# Altium footprint library LukaLIBRARY.PcbLib: 784 footprints (part 29 of 49)
Each footprint in its own frame and in the unit in brackets; x right, y up, seen from the top. Pads: shape width x height; smd on the part's side, far side on the other; paste and mask are expansions set on the pad; w line width, h text height; cw(c..) or ccw(c..) is an arc to the next point about the centre after c.
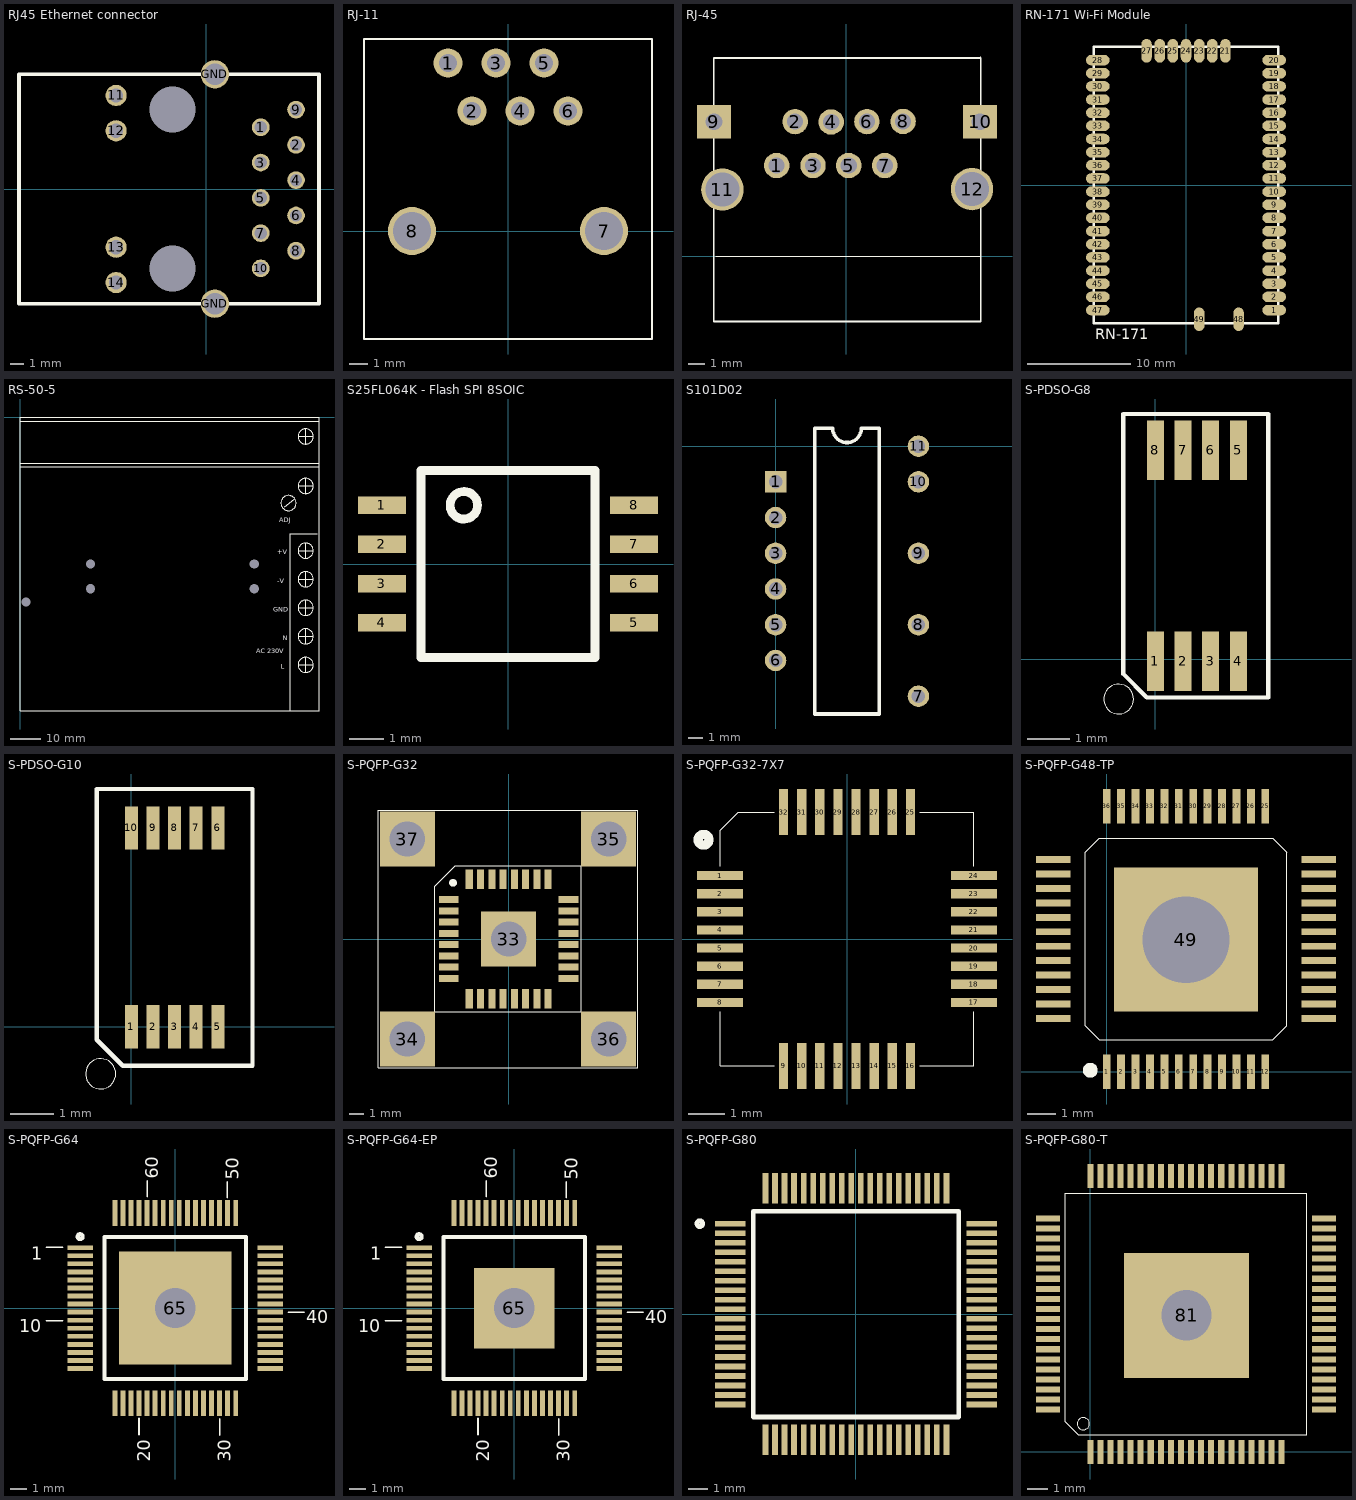
[diagram p28: the footprints below, top view; thin cyan lines are the x and y axes]

## RJ45 Ethernet connector [mil]
pads (18):
  round 50 hole 35: 1(155,175) 2(255,125) 3(155,75) 4(255,25) 5(155,-25) 6(255,-75) 7(155,-125) 8(255,-175) 9(255,225) 10(155,-225)
  round 60 hole 40: 11(-255,265) 12(-255,165) 13(-255,-165) 14(-255,-265)
  round 80 hole 62: GND(25,-325) GND(25,325)
  round 0 hole 130: ""(-95,-225) ""(-95,225)
Top Overlay:
  lines w10: -530,-325 -530,325 320,325 320,-325 -530,-325

## RJ-11 [mil]
pads (8):
  round 60 hole 38 mask-1000: 1(-125,350) 2(-75,250) 3(-25,350) 4(25,250) 5(75,350) 6(125,250)
  round 100 hole 80: 7(200,0) 8(-200,0)
Top Overlay:
  lines w3.94: -300,-225 300,-225 300,400 -300,400 -300,-225
Top Solder:
  drawing of 6 lines, arcs and shapes, not listed
Bottom Solder:
  drawing of 6 lines, arcs and shapes, not listed

## RJ-45 [mil]
pads (12):
  round 60 hole 38 mask-1000: 1(-164.57,214.17) 2(-120.87,317.72) 3(-78.74,214.17) 4(-35.83,316.93) 5(5.51,214.17) 6(48.43,317.72) 7(90.55,214.17) 8(133.86,318.11)
  rect 80x80 hole 40 mask-1000: 9(-312.54,317.44) 10(315.46,317.44)
  round 100 hole 80: 11(-292.54,157.44) 12(296.46,158.44)
Top Overlay:
  lines w0.39: -308.54,0.44 316.46,0.44 ; 315.46,471.44 316.46,-0.56
  lines w3.94: -312.99,-153.94 316.93,-153.94 316.93,468.11 -312.99,468.11 -312.99,-153.94
Top Solder:
  drawing of 10 lines, arcs and shapes, not listed
Bottom Solder:
  drawing of 10 lines, arcs and shapes, not listed

## RN-171 Wi-Fi Module [mil]
pads (49):
  oval 90x40 smd: 1(335,-475) 2(335,-425) 3(335,-375) 4(335,-325) 5(335,-275) 6(335,-225) 7(335,-175) 8(335,-125) 9(335,-75) 10(335,-25) 11(335,25) 12(335,75) 13(335,125) 14(335,175) 15(335,225) 16(335,275) 17(335,325) 18(335,375) 19(335,425) 20(335,475) 28(-335,475) 29(-335,425) 30(-335,375) 31(-335,325) 32(-335,275) 33(-335,225) 34(-335,175) 35(-335,125) 36(-335,75) 37(-335,25) 38(-335,-25) 39(-335,-75) 40(-335,-125) 41(-335,-175) 42(-335,-225) 43(-335,-275) 44(-335,-325) 45(-335,-375) 46(-335,-425) 47(-335,-475)
  oval 40x90 smd: 21(150,510) 22(100,510) 23(50,510) 24(0,510) 25(-50,510) 26(-100,510) 27(-150,510) 48(200,-510) 49(50,-510)
Top Overlay:
  lines w10: -350,-525 350,-525 350,525 -350,525 -350,-525
  text "RN-171" at -345,-585 h40

## RS-50-5 [mil]
pads (5):
  round 0 hole 120 mask-1000: 1(75,-2425) 2(925,-1925) 3(925,-2250) 4(3075,-1925) 5(3075,-2250)
Top Overlay:
  circle w3: c3750,-2875 r100
  circle w3: c3750,-2125 r100
  circle w3: c3750,-2500 r100
  circle w3: c3750,-1750 r100
  circle w3: c3750,-900 r100
  circle w3: c3750,-250 r100
  circle w3: c3750,-3250 r100
  circle w3: c3525,-1125 r100
  lines w3: 0,-650 3925,-650 ; 0,-600 3925,-600 ; 0,-50 3925,-50 ; 3475,-1175 3600,-1075 ; 3550,-3850 3550,-1525 3900,-1525 ; 3650,-3250 3850,-3250 ; 3650,-2875 3850,-2875 ; 3650,-2500 3850,-2500 ; 3650,-2125 3850,-2125 ; 3650,-1750 3850,-1750 ; 3650,-900 3850,-900 ; 3650,-250 3850,-250 ; 3750,-3350 3750,-3150 ; 3750,-2975 3750,-2775 ; 3750,-2600 3750,-2400 ; 3750,-2225 3750,-2025 ; 3750,-1850 3750,-1650 ; 3750,-1000 3750,-800 ; 3750,-350 3750,-150 ; 0,-3850 0,0 3925,0 3925,-3850 0,-3850
  text "N" at 3450,-2925 h62.5
  text "GND" at 3325,-2550 h62.5
  text "ADJ" at 3400,-1375 h62.5
  text "L" at 3425,-3300 h62.5
  text "-V" at 3375,-2175 h62.5
  text "+V" at 3375,-1800 h62.5
  text "AC 230V" at 3100,-3100 h62.5
Top Solder:
  drawing of 5 lines, arcs and shapes, not listed
Bottom Solder:
  drawing of 5 lines, arcs and shapes, not listed

## S25FL064K - Flash SPI 8SOIC [mil]
pads (8):
  rect 55x20 smd: 1(-145,67.5) 2(-145,22.5) 3(-145,-22.5) 4(-145,-67.5) 5(145,-67.5) 6(145,-22.5) 7(145,22.5) 8(145,67.5)
Top Overlay:
  circle w10: c-50.81,67.5 r15.81
  lines w10: -100,-107.5 100,-107.5 100,107.5 -100,107.5 -100,-107.5

## S101D02 [mil]
pads (11):
  rect 60x60 hole 38 mask-1000: 1(0,-100)
  round 60 hole 38 mask-1000: 2(0,-200) 3(0,-300) 4(0,-400) 5(0,-500) 6(0,-600) 7(400,-700) 8(400,-500) 9(400,-300) 10(400,-100) 11(400,0)
Top Overlay:
  lines w10: 110,-750 110,50 160,50 ccw(c200,50) 240,50 290,50 290,-750 110,-750
Top Solder:
  drawing of 11 lines, arcs and shapes, not listed
Bottom Solder:
  drawing of 11 lines, arcs and shapes, not listed

## S-PDSO-G8 [mm]
pads (8):
  rect 0.4x1.4 smd mask-25.4: 1(0,-0.05) 2(0.65,-0.05) 3(1.3,-0.05) 4(1.95,-0.05) 5(1.95,4.9) 6(1.3,4.9) 7(0.65,4.9) 8(0,4.9)
Top Overlay:
  circle w0.025: c-0.86,-0.94 r0.35
  lines w0.1: -0.75,-0.35 -0.75,5.75 2.65,5.75 2.65,-0.9 -0.2,-0.9 -0.75,-0.35
Top Solder:
  region: -0.2,-0.75 0.2,-0.75 0.2,0.65 -0.2,0.65
  region: 0.45,-0.75 0.85,-0.75 0.85,0.65 0.45,0.65
  region: 1.75,-0.75 2.15,-0.75 2.15,0.65 1.75,0.65
  region: 1.1,-0.75 1.5,-0.75 1.5,0.65 1.1,0.65
  region: -0.2,4.2 0.2,4.2 0.2,5.6 -0.2,5.6
  region: 0.45,4.2 0.85,4.2 0.85,5.6 0.45,5.6
  region: 1.1,4.2 1.5,4.2 1.5,5.6 1.1,5.6
  region: 1.75,4.2 2.15,4.2 2.15,5.6 1.75,5.6

## S-PDSO-G10 [mm]
pads (10):
  rect 0.3x1 smd: 1(0,0) 2(0.5,0) 3(1,0) 4(1.5,0) 5(2,0) 6(2,4.6) 7(1.5,4.6) 8(1,4.6) 9(0.5,4.6) 10(0,4.6)
Top Overlay:
  circle w0.025: c-0.71,-1.09 r0.35
  lines w0.1: -0.8,5.1 -0.8,5.5 2.8,5.5 2.8,-0.9 -0.2,-0.9 -0.8,-0.3 -0.8,5.3

## S-PQFP-G32 [mm]
pads (37):
  rect 1.4x0.5 smd mask-25.4: 1(-4.25,2.8) 2(-4.25,2) 3(-4.25,1.2) 4(-4.25,0.4) 5(-4.25,-0.4) 6(-4.25,-1.2) 7(-4.25,-2) 8(-4.25,-2.8) 17(4.25,-2.8) 18(4.25,-2) 19(4.25,-1.2) 20(4.25,-0.4) 21(4.25,0.4) 22(4.25,1.2) 23(4.25,2) 24(4.25,2.8)
  rect 0.5x1.4 smd mask-25.4: 9(-2.8,-4.25) 10(-2,-4.25) 11(-1.2,-4.25) 12(-0.4,-4.25) 13(0.4,-4.25) 14(1.2,-4.25) 15(2,-4.25) 16(2.8,-4.25) 25(2.8,4.25) 26(2,4.25) 27(1.2,4.25) 28(0.4,4.25) 29(-0.4,4.25) 30(-1.2,4.25) 31(-2,4.25) 32(-2.8,4.25)
  rect 3.9x3.9 hole 2.5 unplated mask-25.4: 33(0,0) 34(-7.2,-7.1) 35(7.1,7.1) 36(7.1,-7.1) 37(-7.2,7.1)
Top Overlay:
  circle w0.25: c-3.955,3.986 r0.15
  lines w0.025: -9.25,-9.15 9.15,-9.15 9.15,9.15 -9.25,9.15 -9.25,-9.15 ; -5.25,-5.15 5.15,-5.15 5.15,5.2 -3.8,5.2 -5.25,3.75 -5.25,-5.15
Top Solder:
  region: 3.5,-3.5 3.5,3.5 -3.5,3.5 -3.5,-3.5
  region: -3.7,3.6 -3.7,10.6 -10.7,10.6 -10.7,3.6
  region: 10.6,3.6 10.6,10.6 3.6,10.6 3.6,3.6
  region: -3.7,-10.6 -3.7,-3.6 -10.7,-3.6 -10.7,-10.6
  region: 10.6,-10.6 10.6,-3.6 3.6,-3.6 3.6,-10.6
  region: -1.45,4.95 -1.45,3.55 -0.95,3.55 -0.95,4.95
  region: -0.65,4.95 -0.65,3.55 -0.15,3.55 -0.15,4.95
  region: 0.15,4.95 0.15,3.55 0.65,3.55 0.65,4.95
  region: 0.95,4.95 0.95,3.55 1.45,3.55 1.45,4.95
  region: 1.75,4.95 1.75,3.55 2.25,3.55 2.25,4.95
  region: 2.55,4.95 2.55,3.55 3.05,3.55 3.05,4.95
  region: 4.95,3.05 3.55,3.05 3.55,2.55 4.95,2.55
  region: 4.95,2.25 3.55,2.25 3.55,1.75 4.95,1.75
  region: 4.95,1.45 3.55,1.45 3.55,0.95 4.95,0.95
  region: 4.95,0.65 3.55,0.65 3.55,0.15 4.95,0.15
  region: 4.95,-0.15 3.55,-0.15 3.55,-0.65 4.95,-0.65
  region: 4.95,-0.95 3.55,-0.95 3.55,-1.45 4.95,-1.45
  region: 4.95,-1.75 3.55,-1.75 3.55,-2.25 4.95,-2.25
  region: 4.95,-2.55 3.55,-2.55 3.55,-3.05 4.95,-3.05
  region: 3.05,-4.95 3.05,-3.55 2.55,-3.55 2.55,-4.95
  region: 2.25,-4.95 2.25,-3.55 1.75,-3.55 1.75,-4.95
  region: 1.45,-4.95 1.45,-3.55 0.95,-3.55 0.95,-4.95
  region: 0.65,-4.95 0.65,-3.55 0.15,-3.55 0.15,-4.95
  region: -0.15,-4.95 -0.15,-3.55 -0.65,-3.55 -0.65,-4.95
  region: -0.95,-4.95 -0.95,-3.55 -1.45,-3.55 -1.45,-4.95
  region: -3.05,4.95 -3.05,3.55 -2.55,3.55 -2.55,4.95
  region: -2.25,4.95 -2.25,3.55 -1.75,3.55 -1.75,4.95
  region: -4.95,-0.65 -3.55,-0.65 -3.55,-0.15 -4.95,-0.15
  region: -4.95,0.15 -3.55,0.15 -3.55,0.65 -4.95,0.65
  region: -4.95,0.95 -3.55,0.95 -3.55,1.45 -4.95,1.45
  region: -4.95,1.75 -3.55,1.75 -3.55,2.25 -4.95,2.25
  region: -4.95,2.55 -3.55,2.55 -3.55,3.05 -4.95,3.05
  region: -1.75,-4.95 -1.75,-3.55 -2.25,-3.55 -2.25,-4.95
  region: -2.55,-4.95 -2.55,-3.55 -3.05,-3.55 -3.05,-4.95
  region: -4.95,-3.05 -3.55,-3.05 -3.55,-2.55 -4.95,-2.55
  region: -4.95,-2.25 -3.55,-2.25 -3.55,-1.75 -4.95,-1.75
  region: -4.95,-1.45 -3.55,-1.45 -3.55,-0.95 -4.95,-0.95
Bottom Solder:
  drawing of 5 lines, arcs and shapes, not listed

## S-PQFP-G32-7X7 [mm]
pads (32):
  rect 1.27x0.254 smd mask-25.4: 1(-3.5,1.75) 2(-3.5,1.25) 3(-3.5,0.75) 4(-3.5,0.25) 5(-3.5,-0.25) 6(-3.5,-0.75) 7(-3.5,-1.25) 8(-3.5,-1.75) 17(3.5,-1.75) 18(3.5,-1.25) 19(3.5,-0.75) 20(3.5,-0.25) 21(3.5,0.25) 22(3.5,0.75) 23(3.5,1.25) 24(3.5,1.75)
  rect 0.254x1.27 smd mask-25.4: 9(-1.75,-3.5) 10(-1.25,-3.5) 11(-0.75,-3.5) 12(-0.25,-3.5) 13(0.25,-3.5) 14(0.75,-3.5) 15(1.25,-3.5) 16(1.75,-3.5) 25(1.75,3.5) 26(1.25,3.5) 27(0.75,3.5) 28(0.25,3.5) 29(-0.25,3.5) 30(-0.75,3.5) 31(-1.25,3.5) 32(-1.75,3.5)
Top Overlay:
  circle w0.25: c-3.955,2.736 r0.15
  lines w0.025: -3.5,-2 -3.5,-3.5 -2,-3.5 ; -3.5,2 -3.5,3 -3,3.5 -2,3.5 ; 2,-3.5 3.5,-3.5 3.5,-2 ; 2,3.5 3.5,3.5 3.5,2
Top Solder:
  region: 0.623,4.135 0.623,2.865 0.877,2.865 0.877,4.135
  region: 0.123,4.135 0.123,2.865 0.377,2.865 0.377,4.135
  region: 0.877,-4.135 0.877,-2.865 0.623,-2.865 0.623,-4.135
  region: 0.377,-4.135 0.377,-2.865 0.123,-2.865 0.123,-4.135
  region: 4.135,0.377 2.865,0.377 2.865,0.123 4.135,0.123
  region: 4.135,-0.123 2.865,-0.123 2.865,-0.377 4.135,-0.377
  region: -4.135,0.123 -2.865,0.123 -2.865,0.377 -4.135,0.377
  region: -4.135,-0.377 -2.865,-0.377 -2.865,-0.123 -4.135,-0.123
  region: 1.123,4.135 1.123,2.865 1.377,2.865 1.377,4.135
  region: 1.623,4.135 1.623,2.865 1.877,2.865 1.877,4.135
  region: 4.135,0.877 2.865,0.877 2.865,0.623 4.135,0.623
  region: 4.135,1.877 2.865,1.877 2.865,1.623 4.135,1.623
  region: 4.135,1.377 2.865,1.377 2.865,1.123 4.135,1.123
  region: 1.377,-4.135 1.377,-2.865 1.123,-2.865 1.123,-4.135
  region: 1.877,-4.135 1.877,-2.865 1.623,-2.865 1.623,-4.135
  region: 4.135,-0.623 2.865,-0.623 2.865,-0.877 4.135,-0.877
  region: 4.135,-1.123 2.865,-1.123 2.865,-1.377 4.135,-1.377
  region: 4.135,-1.623 2.865,-1.623 2.865,-1.877 4.135,-1.877
  region: -0.377,4.135 -0.377,2.865 -0.123,2.865 -0.123,4.135
  region: -0.877,4.135 -0.877,2.865 -0.623,2.865 -0.623,4.135
  region: -1.377,4.135 -1.377,2.865 -1.123,2.865 -1.123,4.135
  region: -1.877,4.135 -1.877,2.865 -1.623,2.865 -1.623,4.135
  region: -4.135,1.623 -2.865,1.623 -2.865,1.877 -4.135,1.877
  region: -4.135,0.623 -2.865,0.623 -2.865,0.877 -4.135,0.877
  region: -4.135,1.123 -2.865,1.123 -2.865,1.377 -4.135,1.377
  region: -0.623,-4.135 -0.623,-2.865 -0.877,-2.865 -0.877,-4.135
  region: -0.123,-4.135 -0.123,-2.865 -0.377,-2.865 -0.377,-4.135
  region: -1.123,-4.135 -1.123,-2.865 -1.377,-2.865 -1.377,-4.135
  region: -1.623,-4.135 -1.623,-2.865 -1.877,-2.865 -1.877,-4.135
  region: -4.135,-1.377 -2.865,-1.377 -2.865,-1.123 -4.135,-1.123
  region: -4.135,-0.877 -2.865,-0.877 -2.865,-0.623 -4.135,-0.623
  region: -4.135,-1.877 -2.865,-1.877 -2.865,-1.623 -4.135,-1.623

## S-PQFP-G48-TP [mm]
pads (49):
  rect 0.27x1.2 smd mask-25.4: 1(0,0) 2(0.5,0) 3(1,0) 4(1.5,0) 5(2,0) 6(2.5,0) 7(3,0) 8(3.5,0) 9(4,0) 10(4.5,0) 11(5,0) 12(5.5,0) 25(5.5,9.2) 26(5,9.2) 27(4.5,9.2) 28(4,9.2) 29(3.5,9.2) 30(3,9.2) 31(2.5,9.2) 32(2,9.2) 33(1.5,9.2) 34(1,9.2) 35(0.5,9.2) 36(0,9.2)
  rect 1.2x0.24 smd: 13(7.35,1.85) 14(7.35,2.35) 15(7.35,2.85) 16(7.35,3.35) 17(7.35,3.85) 18(7.35,4.35) 19(7.35,4.85) 20(7.35,5.35) 21(7.35,5.85) 22(7.35,6.35) 23(7.35,6.85) 24(7.35,7.35) 37(-1.85,7.35) 38(-1.85,6.85) 39(-1.85,6.35) 40(-1.85,5.85) 41(-1.85,5.35) 42(-1.85,4.85) 43(-1.85,4.35) 44(-1.85,3.85) 45(-1.85,3.35) 46(-1.85,2.85) 47(-1.85,2.35) 48(-1.85,1.85)
  rect 5x5 hole 3 unplated: 49(2.75,4.58)
Top Overlay:
  circle w0.254: c-0.57,0.05 r0.13
  lines w0.025: -0.75,1.6 -0.25,1.1 5.75,1.1 6.25,1.6 6.25,7.6 5.75,8.1 -0.25,8.1 -0.75,7.6 -0.75,1.6
Top Solder:
  region: -0.135,-0.6 0.135,-0.6 0.135,0.6 -0.135,0.6
  region: 0.365,-0.6 0.635,-0.6 0.635,0.6 0.365,0.6
  region: 0.865,-0.6 1.135,-0.6 1.135,0.6 0.865,0.6
  region: 1.365,-0.6 1.635,-0.6 1.635,0.6 1.365,0.6
  region: 1.865,-0.6 2.135,-0.6 2.135,0.6 1.865,0.6
  region: 2.365,-0.6 2.635,-0.6 2.635,0.6 2.365,0.6
  region: 2.865,-0.6 3.135,-0.6 3.135,0.6 2.865,0.6
  region: 3.365,-0.6 3.635,-0.6 3.635,0.6 3.365,0.6
  region: 3.865,-0.6 4.135,-0.6 4.135,0.6 3.865,0.6
  region: 4.365,-0.6 4.635,-0.6 4.635,0.6 4.365,0.6
  region: 4.365,8.6 4.635,8.6 4.635,9.8 4.365,9.8
  region: 3.865,8.6 4.135,8.6 4.135,9.8 3.865,9.8
  region: 3.365,8.6 3.635,8.6 3.635,9.8 3.365,9.8
  region: 2.865,8.6 3.135,8.6 3.135,9.8 2.865,9.8
  region: 2.365,8.6 2.635,8.6 2.635,9.8 2.365,9.8
  region: 1.865,8.6 2.135,8.6 2.135,9.8 1.865,9.8
  region: 1.365,8.6 1.635,8.6 1.635,9.8 1.365,9.8
  region: 0.865,8.6 1.135,8.6 1.135,9.8 0.865,9.8
  region: 0.365,8.6 0.635,8.6 0.635,9.8 0.365,9.8
  region: -0.135,8.6 0.135,8.6 0.135,9.8 -0.135,9.8
  region: 5.365,-0.6 5.635,-0.6 5.635,0.6 5.365,0.6
  region: 5.365,8.6 5.635,8.6 5.635,9.8 5.365,9.8
  region: 4.865,-0.6 5.135,-0.6 5.135,0.6 4.865,0.6
  region: 4.865,8.6 5.135,8.6 5.135,9.8 4.865,9.8

## S-PQFP-G64 [mm]
pads (65):
  rect 1.6x0.3 smd: 1(-5.9,3.75) 2(-5.9,3.25) 3(-5.9,2.75) 4(-5.9,2.25) 5(-5.9,1.75) 6(-5.9,1.25) 7(-5.9,0.75) 8(-5.9,0.25) 9(-5.9,-0.25) 10(-5.9,-0.75) 11(-5.9,-1.25) 12(-5.9,-1.75) 13(-5.9,-2.25) 14(-5.9,-2.75) 15(-5.9,-3.25) 16(-5.9,-3.75) 33(5.9,-3.75) 34(5.9,-3.25) 35(5.9,-2.75) 36(5.9,-2.25) 37(5.9,-1.75) 38(5.9,-1.25) 39(5.9,-0.75) 40(5.9,-0.25) 41(5.9,0.25) 42(5.9,0.75) 43(5.9,1.25) 44(5.9,1.75) 45(5.9,2.25) 46(5.9,2.75) 47(5.9,3.25) 48(5.9,3.75)
  rect 0.3x1.6 smd: 17(-3.75,-5.9) 18(-3.25,-5.9) 19(-2.75,-5.9) 20(-2.25,-5.9) 21(-1.75,-5.9) 22(-1.25,-5.9) 23(-0.75,-5.9) 24(-0.25,-5.9) 25(0.25,-5.9) 26(0.75,-5.9) 27(1.25,-5.9) 28(1.75,-5.9) 29(2.25,-5.9) 30(2.75,-5.9) 31(3.25,-5.9) 32(3.75,-5.9) 49(3.75,5.9) 50(3.25,5.9) 51(2.75,5.9) 52(2.25,5.9) 53(1.75,5.9) 54(1.25,5.9) 55(0.75,5.9) 56(0.25,5.9) 57(-0.25,5.9) 58(-0.75,5.9) 59(-1.25,5.9) 60(-1.75,5.9) 61(-2.25,5.9) 62(-2.75,5.9) 63(-3.25,5.9) 64(-3.75,5.9)
  rect 7x7 hole 2.5 unplated mask-25.4: 65(0,0)
Top Overlay:
  circle w0.25: c-5.905,4.436 r0.15
  lines w0.1: -8,-0.775 -7,-0.775 ; -8,3.775 -7,3.775 ; -2.25,-7.85 -2.25,-6.85 ; -1.75,6.9 -1.75,7.9 ; 2.75,-7.875 2.75,-6.875 ; 3.225,6.85 3.225,7.85 ; 7,-0.25 8,-0.25
  lines w0.25: -4.4,-4.4 4.4,-4.4 4.4,4.4 -4.4,4.4 -4.4,-4.4
  text "40" at 8.125,-0.95 h0.79
  text "10" at -9.7,-1.5 h0.79
  text "50" at 3.925,7.975 h0.79
  text "30" at 3.45,-9.525 h0.79
  text "60" at -1.05,8.025 h0.79
  text "20" at -1.55,-9.55 h0.79
  text "1" at -8.925,3 h0.79
Top Solder:
  region: 3.5,-3.5 3.5,3.5 -3.5,3.5 -3.5,-3.5
Bottom Solder:
  region: -1.507,0 -1.478,-0.294 -1.393,-0.577 -1.253,-0.837 -1.066,-1.066 -0.837,-1.253 -0.577,-1.393 -0.294,-1.478 0,-1.507 0.294,-1.478 0.577,-1.393 0.837,-1.253 1.066,-1.066 1.253,-0.837 1.393,-0.577 1.478,-0.294 1.507,0 1.478,0.294 1.393,0.577 1.253,0.837 1.066,1.066 0.837,1.253 0.577,1.393 0.294,1.478 0,1.507 -0.294,1.478 -0.577,1.393 -0.837,1.253 -1.066,1.066 -1.253,0.837 -1.393,0.577 -1.478,0.294

## S-PQFP-G64-EP [mm]
pads (65):
  rect 1.6x0.3 smd: 1(-5.9,3.75) 2(-5.9,3.25) 3(-5.9,2.75) 4(-5.9,2.25) 5(-5.9,1.75) 6(-5.9,1.25) 7(-5.9,0.75) 8(-5.9,0.25) 9(-5.9,-0.25) 10(-5.9,-0.75) 11(-5.9,-1.25) 12(-5.9,-1.75) 13(-5.9,-2.25) 14(-5.9,-2.75) 15(-5.9,-3.25) 16(-5.9,-3.75) 33(5.9,-3.75) 34(5.9,-3.25) 35(5.9,-2.75) 36(5.9,-2.25) 37(5.9,-1.75) 38(5.9,-1.25) 39(5.9,-0.75) 40(5.9,-0.25) 41(5.9,0.25) 42(5.9,0.75) 43(5.9,1.25) 44(5.9,1.75) 45(5.9,2.25) 46(5.9,2.75) 47(5.9,3.25) 48(5.9,3.75)
  rect 0.3x1.6 smd: 17(-3.75,-5.9) 18(-3.25,-5.9) 19(-2.75,-5.9) 20(-2.25,-5.9) 21(-1.75,-5.9) 22(-1.25,-5.9) 23(-0.75,-5.9) 24(-0.25,-5.9) 25(0.25,-5.9) 26(0.75,-5.9) 27(1.25,-5.9) 28(1.75,-5.9) 29(2.25,-5.9) 30(2.75,-5.9) 31(3.25,-5.9) 32(3.75,-5.9) 49(3.75,5.9) 50(3.25,5.9) 51(2.75,5.9) 52(2.25,5.9) 53(1.75,5.9) 54(1.25,5.9) 55(0.75,5.9) 56(0.25,5.9) 57(-0.25,5.9) 58(-0.75,5.9) 59(-1.25,5.9) 60(-1.75,5.9) 61(-2.25,5.9) 62(-2.75,5.9) 63(-3.25,5.9) 64(-3.75,5.9)
  rect 5x5 on Top hole 2.5 unplated mask-25.4: 65(0,0)
Top Overlay:
  circle w0.25: c-5.905,4.436 r0.15
  lines w0.1: -8,-0.775 -7,-0.775 ; -8,3.775 -7,3.775 ; -2.25,-7.85 -2.25,-6.85 ; -1.75,6.9 -1.75,7.9 ; 2.75,-7.875 2.75,-6.875 ; 3.225,6.85 3.225,7.85 ; 7,-0.25 8,-0.25
  lines w0.25: -4.4,-4.4 -4.4,4.4 4.4,4.4 4.4,-4.4 -4.4,-4.4
  text "1" at -8.925,3 h0.79
  text "20" at -1.55,-9.55 h0.79
  text "60" at -1.05,8.025 h0.79
  text "30" at 3.45,-9.525 h0.79
  text "50" at 3.925,7.975 h0.79
  text "10" at -9.7,-1.5 h0.79
  text "40" at 8.125,-0.95 h0.79
Top Solder:
  region: 2.5,-2.5 2.5,2.5 -2.5,2.5 -2.5,-2.5
Bottom Solder:
  region: 2.5,-2.5 2.5,2.5 -2.5,2.5 -2.5,-2.5

## S-PQFP-G80 [mm]
pads (80):
  rect 1.6x0.3 smd: 1(-6.6,4.75) 2(-6.6,4.25) 3(-6.6,3.75) 4(-6.6,3.25) 5(-6.6,2.75) 6(-6.6,2.25) 7(-6.6,1.75) 8(-6.6,1.25) 9(-6.6,0.75) 10(-6.6,0.25) 11(-6.6,-0.25) 12(-6.6,-0.75) 13(-6.6,-1.25) 14(-6.6,-1.75) 15(-6.6,-2.25) 16(-6.6,-2.75) 17(-6.6,-3.25) 18(-6.6,-3.75) 19(-6.6,-4.25) 20(-6.6,-4.75) 41(6.608,-4.75) 42(6.608,-4.25) 43(6.608,-3.75) 44(6.608,-3.25) 45(6.608,-2.75) 46(6.608,-2.25) 47(6.608,-1.75) 48(6.608,-1.25) 49(6.608,-0.75) 50(6.608,-0.25) 51(6.608,0.25) 52(6.608,0.75) 53(6.608,1.25) 54(6.608,1.75) 55(6.608,2.25) 56(6.608,2.75) 57(6.608,3.25) 58(6.608,3.75) 59(6.608,4.25) 60(6.608,4.75)
  rect 0.3x1.6 smd: 21(-4.75,-6.6) 22(-4.25,-6.6) 23(-3.75,-6.6) 24(-3.25,-6.6) 25(-2.75,-6.6) 26(-2.25,-6.6) 27(-1.75,-6.6) 28(-1.25,-6.6) 29(-0.75,-6.6) 30(-0.25,-6.6) 31(0.25,-6.6) 32(0.75,-6.6) 33(1.25,-6.6) 34(1.75,-6.6) 35(2.25,-6.6) 36(2.75,-6.6) 37(3.25,-6.6) 38(3.75,-6.6) 39(4.25,-6.6) 40(4.75,-6.6) 61(4.75,6.608) 62(4.25,6.608) 63(3.75,6.608) 64(3.25,6.608) 65(2.75,6.608) 66(2.25,6.608) 67(1.75,6.608) 68(1.25,6.608) 69(0.75,6.608) 70(0.25,6.608) 71(-0.25,6.608) 72(-0.75,6.608) 73(-1.25,6.608) 74(-1.75,6.608) 75(-2.25,6.608) 76(-2.75,6.608) 77(-3.25,6.608) 78(-3.75,6.608) 79(-4.25,6.608) 80(-4.75,6.608)
Top Overlay:
  circle w0.25: c-8.2,4.75 r0.15
  lines w0.25: -5.4,-5.4 -5.4,5.4 5.4,5.4 5.4,-5.4 -5.4,-5.4

## S-PQFP-G80-T [mm]
pads (81):
  rect 0.3x1.2 smd: 1(0,0) 2(0.5,0) 3(1,0) 4(1.5,0) 5(2,0) 6(2.5,0) 7(3,0) 8(3.5,0) 9(4,0) 10(4.5,0) 11(5,0) 12(5.5,0) 13(6,0) 14(6.5,0) 15(7,0) 16(7.5,0) 17(8,0) 18(8.5,0) 19(9,0) 20(9.5,0) 41(9.5,13.7) 42(9,13.7) 43(8.5,13.7) 44(8,13.7) 45(7.5,13.7) 46(7,13.7) 47(6.5,13.7) 48(6,13.7) 49(5.5,13.7) 50(5,13.7) 51(4.5,13.7) 52(4,13.7) 53(3.5,13.7) 54(3,13.7) 55(2.5,13.7) 56(2,13.7) 57(1.5,13.7) 58(1,13.7) 59(0.5,13.7) 60(0,13.7)
  rect 1.2x0.3 smd: 21(11.6,2.1) 22(11.6,2.6) 23(11.6,3.1) 24(11.6,3.6) 25(11.6,4.1) 26(11.6,4.6) 27(11.6,5.1) 28(11.6,5.6) 29(11.6,6.1) 30(11.6,6.6) 31(11.6,7.1) 32(11.6,7.6) 33(11.6,8.1) 34(11.6,8.6) 35(11.6,9.1) 36(11.6,9.6) 37(11.6,10.1) 38(11.6,10.6) 39(11.6,11.1) 40(11.6,11.6) 61(-2.1,11.6) 62(-2.1,11.1) 63(-2.1,10.6) 64(-2.1,10.1) 65(-2.1,9.6) 66(-2.1,9.1) 67(-2.1,8.6) 68(-2.1,8.1) 69(-2.1,7.6) 70(-2.1,7.1) 71(-2.1,6.6) 72(-2.1,6.1) 73(-2.1,5.6) 74(-2.1,5.1) 75(-2.1,4.6) 76(-2.1,4.1) 77(-2.1,3.6) 78(-2.1,3.1) 79(-2.1,2.6) 80(-2.1,2.1)
  rect 6.2x6.2 hole 2.5 mask-25.4: 81(4.775,6.782)
Top Overlay:
  circle w0.025: c-0.35,1.4 r0.3
  lines w0.025: -1.25,1.5 -0.6,0.85 10.75,0.85 10.75,12.85 -1.25,12.85 -1.25,1.5
Top Solder:
  region: 1.675,3.682 7.875,3.682 7.875,9.882 1.675,9.882
Bottom Solder:
  region: 1.675,3.682 7.875,3.682 7.875,9.882 1.675,9.882